# Altium footprint library IC.PcbLib: 220 footprints (part 8 of 14)
Each footprint in its own frame and in the unit in brackets; x right, y up, seen from the top. Pads: shape width x height; smd on the part's side, far side on the other; paste and mask are expansions set on the pad; w line width, h text height; cw(c..) or ccw(c..) is an arc to the next point about the centre after c.
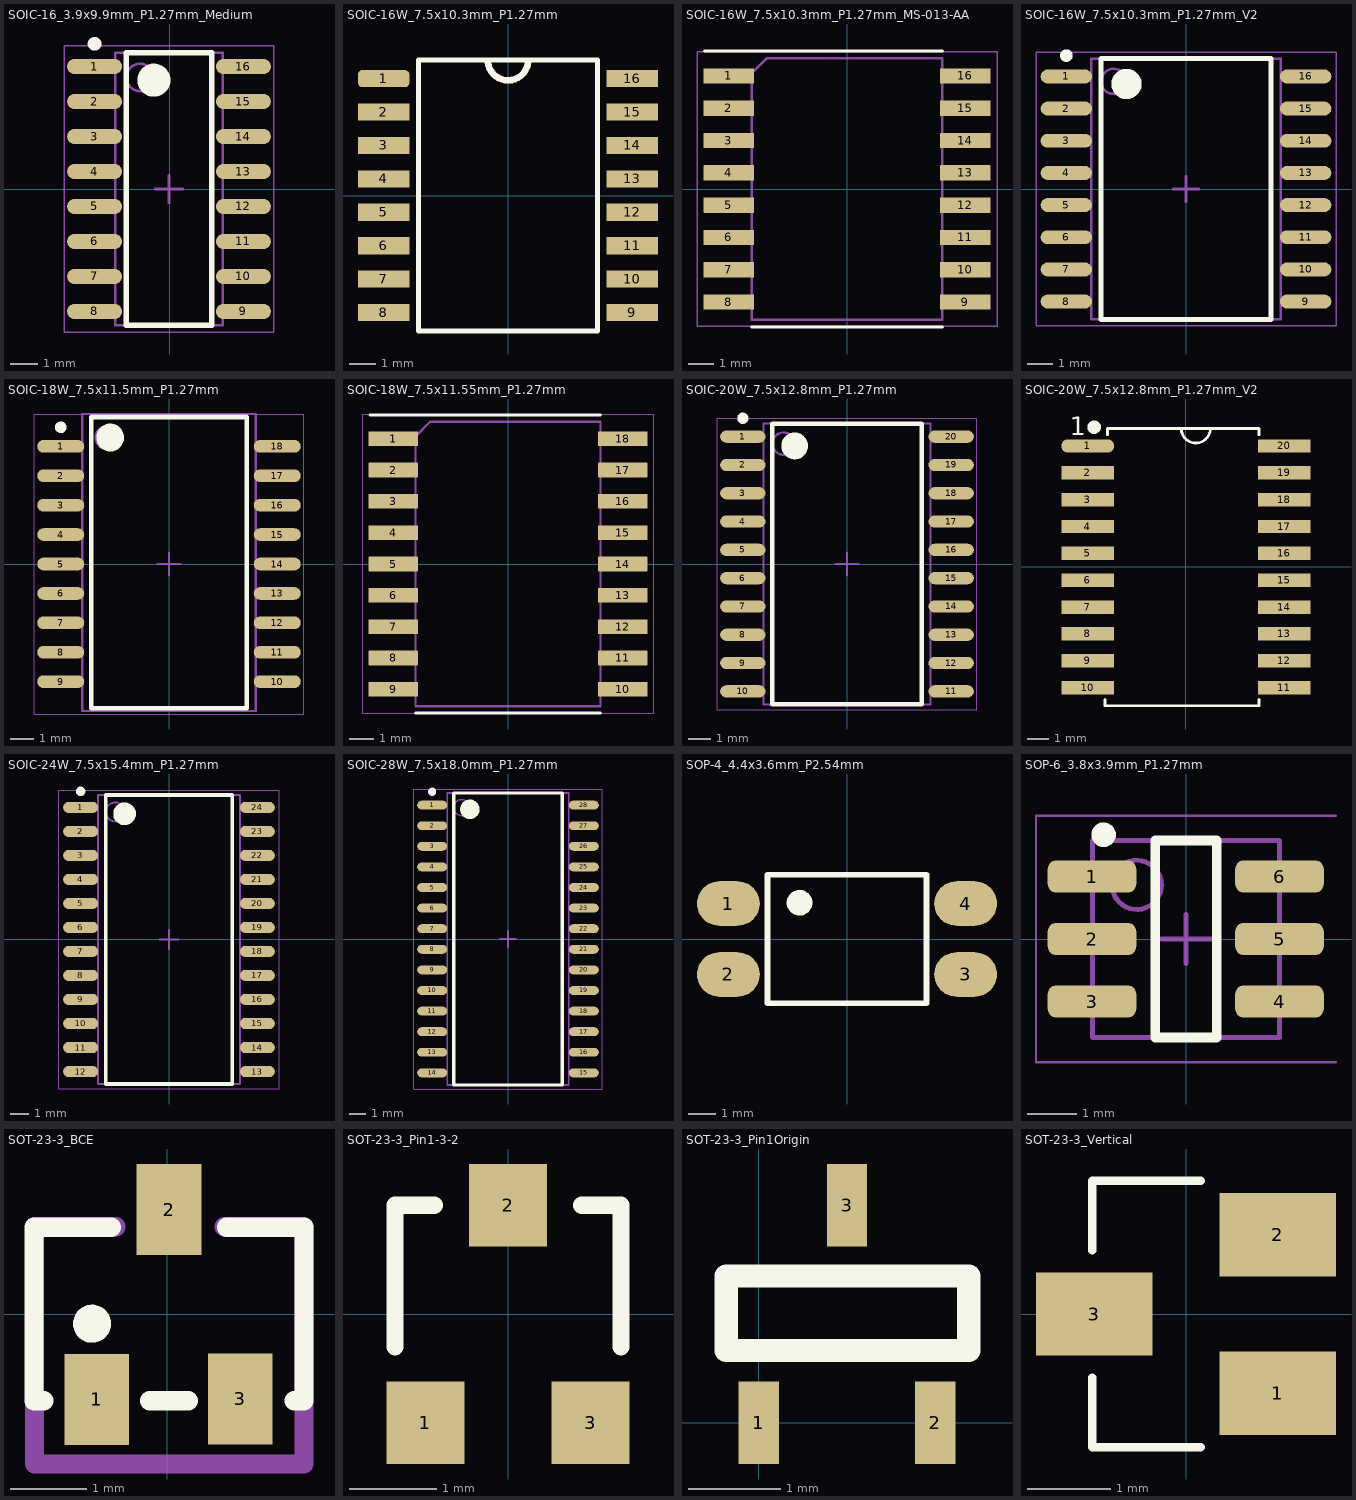
[diagram p7: the footprints below, top view; thin cyan lines are the x and y axes]

## SOIC-16_3.9x9.9mm_P1.27mm_Medium [mm] "SOIC-16 narrow (150mil), body 3.9x9.9mm, pitch 1.27mm, IPC medium"
height 1.75
pads (16):
  oval 2x0.55 smd: 1(-2.727,4.455) 2(-2.727,3.185) 3(-2.727,1.915) 4(-2.727,0.645) 5(-2.727,-0.625) 6(-2.727,-1.895) 7(-2.727,-3.165) 8(-2.727,-4.435) 9(2.673,-4.435) 10(2.673,-3.165) 11(2.673,-1.895) 12(2.673,-0.625) 13(2.673,0.645) 14(2.673,1.915) 15(2.673,3.185) 16(2.673,4.455)
Top Overlay:
  circle w0.6: c-0.577,3.96 r0.3
  circle w0.25: c-2.727,5.28 r0.125
  lines w0.2: -1.577,-4.94 1.523,-4.94 1.523,4.96 -1.577,4.96 -1.577,-4.94
Mechanical 13:
  circle w0.1: c-1.077,4.06 r0.5
  lines w0.1: -1.977,-4.94 1.923,-4.94 1.923,4.96 -1.977,4.96 -1.977,-4.94
Mechanical 15:
  lines w0.05: -3.837,-5.19 3.783,-5.19 3.783,5.21 -3.837,5.21 -3.837,-5.19
  lines w0.1: -0.527,0.01 0.473,0.01 ; -0.027,-0.49 -0.027,0.51
3D body "User Library-SOIC-16-1.step": height 1.4, standoff 0, extent -3.027,-4.94 2.973,4.96

## SOIC-16W_7.5x10.3mm_P1.27mm [mm] "SOIC-16 wide (300mil), body 7.5x10.3mm, pitch 1.27mm"
height 2.6
pads (16):
  rrect50% 1.95x0.65 smd: 1(-4.725,4.445)
  rect 1.95x0.65 smd: 2(-4.725,3.175) 3(-4.725,1.905) 4(-4.725,0.635) 5(-4.725,-0.635) 6(-4.725,-1.905) 7(-4.725,-3.175) 8(-4.725,-4.445) 9(4.725,-4.445) 10(4.725,-3.175) 11(4.725,-1.905) 12(4.725,-0.635) 13(4.725,0.635) 14(4.725,1.905) 15(4.725,3.175) 16(4.725,4.445)
Top Overlay:
  lines w0.2: -3.4,-5.15 3.4,-5.15 3.4,5.15 -3.4,5.15 -3.4,-5.15
  lines w0.254: -0.767,5.077 ccw(c0,5.15) 0.769,5.105
3D body "ACS720KLATR-65AB-T.stp": height 2.65, standoff 0, extent -5.15,-5.15 5.15,5.15

## SOIC-16W_7.5x10.3mm_P1.27mm_MS-013-AA [mm] "16-lead IC package, 7.5 × 10.3 mm, 1.27 mm pitch — Vỏ IC 16 chân, thân 7.5 × 10.3 mm, bước chân 1.27 mm [Vo IC 16 chan, than 7.5 × 10.3 mm, buoc chan 1.27 mm]"
height 2.65
pads (16):
  rrect8% 2x0.6 smd: 1(-4.65,4.445) 2(-4.65,3.175) 3(-4.65,1.905) 4(-4.65,0.635) 5(-4.65,-0.635) 6(-4.65,-1.905) 7(-4.65,-3.175) 8(-4.65,-4.445) 9(4.65,-4.445) 10(4.65,-3.175) 11(4.65,-1.905) 12(4.65,-0.635) 13(4.65,0.635) 14(4.65,1.905) 15(4.65,3.175) 16(4.65,4.445)
Top Overlay:
  lines w0.12: -5.6,5.42 3.75,5.42 ; -3.75,-5.42 3.75,-5.42
  text ".Designator" at -3.75,5.6 h1
Mechanical 2:
  lines w0.1: -3.75,-5.15 3.75,-5.15 3.75,5.15 -3.15,5.15 -3.75,4.55 -3.75,-5.15
Mechanical 4:
  lines w0.05: -5.9,-5.4 5.9,-5.4 5.9,5.4 -5.9,5.4 -5.9,-5.4
3D body "SOIC-16W_7.5x10.3mm_P1.27mm_MS-013-AA.step": height 0, standoff 0, extent -5.65,-4.745 5.65,4.745

## SOIC-16W_7.5x10.3mm_P1.27mm_V2 [mm] "SOIC-16 wide (300mil), body 7.5x10.3mm, pitch 1.27mm, SO-16W 3D"
height 2.4
pads (16):
  oval 2.032x0.55 smd: 1(-4.725,4.445) 2(-4.725,3.175) 3(-4.725,1.905) 4(-4.725,0.635) 5(-4.725,-0.635) 6(-4.725,-1.905) 7(-4.725,-3.175) 8(-4.725,-4.445) 9(4.725,-4.445) 10(4.725,-3.175) 11(4.725,-1.905) 12(4.725,-0.635) 13(4.725,0.635) 14(4.725,1.905) 15(4.725,3.175) 16(4.725,4.445)
Top Overlay:
  circle w0.6: c-2.35,4.15 r0.3
  circle w0.25: c-4.725,5.27 r0.125
  lines w0.2: -3.35,-5.15 3.35,-5.15 3.35,5.15 -3.35,5.15 -3.35,-5.15
Mechanical 13:
  circle w0.1: c-2.85,4.25 r0.5
  lines w0.1: -3.75,-5.15 3.75,-5.15 3.75,5.15 -3.75,5.15 -3.75,-5.15
Mechanical 15:
  lines w0.05: -5.925,-5.4 5.925,-5.4 5.925,5.4 -5.925,5.4 -5.925,-5.4
  lines w0.1: -0.5,0 0.5,0 ; 0,-0.5 0,0.5
3D body "User Library-SO-16W.STEP": height 2.48, standoff 0, extent -5.155,-5.165 5.155,5.165

## SOIC-18W_7.5x11.5mm_P1.27mm [mm] "SOIC-18 wide (300mil), body 7.5x11.5mm, pitch 1.27mm"
height 2.3
pads (18):
  oval 2.032x0.55 smd: 1(-4.675,5.08) 2(-4.675,3.81) 3(-4.675,2.54) 4(-4.675,1.27) 5(-4.675,0) 6(-4.675,-1.27) 7(-4.675,-2.54) 8(-4.675,-3.81) 9(-4.675,-5.08) 10(4.675,-5.08) 11(4.675,-3.81) 12(4.675,-2.54) 13(4.675,-1.27) 14(4.675,0) 15(4.675,1.27) 16(4.675,2.54) 17(4.675,3.81) 18(4.675,5.08)
Top Overlay:
  circle w0.25: c-4.675,5.905 r0.125
  circle w0.6: c-2.54,5.461 r0.3
  lines w0.2: -3.35,-6.223 -3.35,6.35 3.35,6.35 3.35,-6.223 -3.35,-6.223
Mechanical 13:
  circle w0.1: c-2.667,5.461 r0.5
  lines w0.1: -3.75,-6.35 -3.75,6.477 3.75,6.477 3.75,-6.35 -3.75,-6.35
Mechanical 15:
  lines w0.05: -5.825,-6.477 -5.825,6.477 5.825,6.477 5.825,-6.477 -5.825,-6.477
  lines w0.1: -0.5,0 0.5,0 ; 0,-0.5 0,0.5
3D body "User Library-SOIC18-300.step": height 2.7, standoff 0.05, extent -5.15,-5.765 5.15,5.765

## SOIC-18W_7.5x11.55mm_P1.27mm [mm] "ULN2803ADWR, Eight-channel 50 V Darlington sink array, 500 mA per channel max — Mảng đệm Darlington kéo dòng tám kênh, 50 V, tối đa 500 mA mỗi kênh [Mang dem Darlington keo dong tam kenh, 50 V, toi da 500 mA moi kenh]"
height 2.65
pads (18):
  rrect8% 2x0.6 smd: 1(-4.65,5.08) 2(-4.65,3.81) 3(-4.65,2.54) 4(-4.65,1.27) 5(-4.65,0) 6(-4.65,-1.27) 7(-4.65,-2.54) 8(-4.65,-3.81) 9(-4.65,-5.08) 10(4.65,-5.08) 11(4.65,-3.81) 12(4.65,-2.54) 13(4.65,-1.27) 14(4.65,0) 15(4.65,1.27) 16(4.65,2.54) 17(4.65,3.81) 18(4.65,5.08)
Top Overlay:
  lines w0.12: -5.6,6.045 3.75,6.045 ; -3.75,-6.045 3.75,-6.045
  text ".Designator" at -3.75,6.25 h1
Mechanical 2:
  lines w0.1: -3.75,-5.775 3.75,-5.775 3.75,5.775 -3.15,5.775 -3.75,5.175 -3.75,-5.775
Mechanical 4:
  lines w0.05: -5.9,-6.05 5.9,-6.05 5.9,6.05 -5.9,6.05 -5.9,-6.05
3D body "SOIC-18W_7.5x11.55mm_P1.27mm.step": height 0, standoff 0, extent -5.65,-5.38 5.65,5.38

## SOIC-20W_7.5x12.8mm_P1.27mm [mm] "SOIC-20 wide (300mil), body 7.5x12.8mm, pitch 1.27mm"
height 2.65
pads (20):
  oval 2.032x0.55 smd: 1(-4.675,5.715) 2(-4.675,4.445) 3(-4.675,3.175) 4(-4.675,1.905) 5(-4.675,0.635) 6(-4.675,-0.635) 7(-4.675,-1.905) 8(-4.675,-3.175) 9(-4.675,-4.445) 10(-4.675,-5.715) 11(4.675,-5.715) 12(4.675,-4.445) 13(4.675,-3.175) 14(4.675,-1.905) 15(4.675,-0.635) 16(4.675,0.635) 17(4.675,1.905) 18(4.675,3.175) 19(4.675,4.445) 20(4.675,5.715)
Top Overlay:
  circle w0.6: c-2.35,5.3 r0.3
  circle w0.25: c-4.675,6.54 r0.125
  lines w0.2: -3.35,-6.3 3.35,-6.3 3.35,6.3 -3.35,6.3 -3.35,-6.3
Mechanical 13:
  circle w0.1: c-2.85,5.4 r0.5
  lines w0.1: -3.75,-6.3 3.75,-6.3 3.75,6.3 -3.75,6.3 -3.75,-6.3
Mechanical 15:
  lines w0.05: -5.825,-6.55 5.825,-6.55 5.825,6.55 -5.825,6.55 -5.825,-6.55
  lines w0.1: -0.5,0 0.5,0 ; 0,-0.5 0,0.5
3D body "User Library-SOIC20.step": height 2.25, standoff 0.01, extent -5.067,-6.3 5.067,6.3

## SOIC-20W_7.5x12.8mm_P1.27mm_V2 [mm] "SOIC-20 wide (300mil), body 7.5x12.8mm, pitch 1.27mm, span 9.3mm"
pads (20):
  oval 2.5x0.635 smd mask+0.076: 1(-4.65,5.715)
  rect 2.5x0.635 smd mask+0.076: 2(-4.65,4.445) 3(-4.65,3.175) 4(-4.65,1.905) 5(-4.65,0.635) 6(-4.65,-0.635) 7(-4.65,-1.905) 8(-4.65,-3.175) 9(-4.65,-4.445) 10(-4.65,-5.715) 11(4.65,-5.715) 12(4.65,-4.445) 13(4.65,-3.175) 14(4.65,-1.905) 15(4.65,-0.635) 16(4.65,0.635) 17(4.65,1.905) 18(4.65,3.175) 19(4.65,4.445) 20(4.65,5.715)
Top Overlay:
  circle w0.381: c-4.346,6.604 r0.127
  lines w0.127: -3.836,-6.283 -3.836,-6.575 3.45,-6.575 3.45,-6.283 ; -3.711,6.248 -3.711,6.54 3.45,6.54 3.45,6.248 ; -0.224,6.54 ccw(c0.463,6.54) 1.15,6.54
  text "1" at -5.489,6.223 h0.89
3D body "User Library-SOIC20.step": height 2.25, standoff 0.01, extent -5.067,-6.3 5.067,6.3

## SOIC-24W_7.5x15.4mm_P1.27mm [mm] "SOIC-24 wide (300mil), body 7.5x15.4mm, pitch 1.27mm"
height 2.3
pads (24):
  oval 1.85x0.6 smd: 1(-4.675,6.985) 2(-4.675,5.715) 3(-4.675,4.445) 4(-4.675,3.175) 5(-4.675,1.905) 6(-4.675,0.635) 7(-4.675,-0.635) 8(-4.675,-1.905) 9(-4.675,-3.175) 10(-4.675,-4.445) 11(-4.675,-5.715) 12(-4.675,-6.985) 13(4.675,-6.985) 14(4.675,-5.715) 15(4.675,-4.445) 16(4.675,-3.175) 17(4.675,-1.905) 18(4.675,-0.635) 19(4.675,0.635) 20(4.675,1.905) 21(4.675,3.175) 22(4.675,4.445) 23(4.675,5.715) 24(4.675,6.985)
Top Overlay:
  circle w0.25: c-4.675,7.835 r0.125
  circle w0.6: c-2.35,6.65 r0.3
  lines w0.2: -3.35,-7.65 -3.35,7.65 3.35,7.65 3.35,-7.65 -3.35,-7.65
Mechanical 13:
  circle w0.1: c-2.85,6.75 r0.5
  lines w0.1: -3.75,-7.65 -3.75,7.65 3.75,7.65 3.75,-7.65 -3.75,-7.65
Mechanical 15:
  lines w0.05: -5.825,-7.9 -5.825,7.9 5.825,7.9 5.825,-7.9 -5.825,-7.9
  lines w0.1: -0.5,0 0.5,0 ; 0,-0.5 0,0.5
3D body "User Library-SOIC_24.STEP": height 2.6, standoff 0, extent -5.2,-7.835 5.2,7.565

## SOIC-28W_7.5x18.0mm_P1.27mm [mm] "SOIC-28 wide (300mil), body 7.5x18.0mm, pitch 1.27mm"
height 2.3
pads (28):
  oval 1.85x0.55 smd: 1(-4.675,8.255) 2(-4.675,6.985) 3(-4.675,5.715) 4(-4.675,4.445) 5(-4.675,3.175) 6(-4.675,1.905) 7(-4.675,0.635) 8(-4.675,-0.635) 9(-4.675,-1.905) 10(-4.675,-3.175) 11(-4.675,-4.445) 12(-4.675,-5.715) 13(-4.675,-6.985) 14(-4.675,-8.255) 15(4.675,-8.255) 16(4.675,-6.985) 17(4.675,-5.715) 18(4.675,-4.445) 19(4.675,-3.175) 20(4.675,-1.905) 21(4.675,-0.635) 22(4.675,0.635) 23(4.675,1.905) 24(4.675,3.175) 25(4.675,4.445) 26(4.675,5.715) 27(4.675,6.985) 28(4.675,8.255)
Top Overlay:
  circle w0.6: c-2.35,8 r0.3
  circle w0.25: c-4.675,9.08 r0.125
  lines w0.2: -3.35,-9 3.35,-9 3.35,9 -3.35,9 -3.35,-9
Mechanical 13:
  circle w0.1: c-2.85,8.1 r0.5
  lines w0.1: -3.75,-9 3.75,-9 3.75,9 -3.75,9 -3.75,-9
Mechanical 15:
  lines w0.05: -5.825,-9.25 5.825,-9.25 5.825,9.25 -5.825,9.25 -5.825,-9.25
  lines w0.1: -0.5,0 0.5,0 ; 0,-0.5 0,0.5
3D body "User Library-28-SOIC.step": height 2.73, standoff -0.03, extent -5.023,-9.01 5.277,8.89

## SOP-4_4.4x3.6mm_P2.54mm [mm] "SOP-4 optocoupler/SMD package, pitch 2.54mm, span 8.5mm"
pads (4):
  oval 2.25x1.6 smd: 1(-4.25,1.27) 2(-4.25,-1.27) 3(4.25,-1.27) 4(4.25,1.27)
Top Overlay:
  circle w0.2: c-1.7,1.3 r0.361
  region: -1.4,1.003 -2.006,1.003 -2.006,1.6 -1.4,1.6
  lines w0.2: -2.85,-2.3 2.85,-2.3 2.85,2.3 -2.85,2.3 -2.85,-2.3
3D body "pc817x1nip1b.stp": height 3.6, standoff 0, extent -4.673,-2.286 4.927,2.314

## SOP-6_3.8x3.9mm_P1.27mm [mm] "SOP-6, pitch 1.27mm, span 3.81mm"
height 1.1
pads (6):
  rrect50% 1.8x0.65 smd: 1(-1.91,1.27) 2(-1.91,0) 3(-1.91,-1.27) 4(1.9,-1.27) 5(1.9,0) 6(1.9,1.27)
Top Overlay:
  circle w0.25: c-1.675,2.12 r0.125
  lines w0.2: -0.625,-2 0.625,-2 0.625,2 -0.625,2 -0.625,-2
Mechanical 13:
  circle w0.1: c-1,1.1 r0.5
  lines w0.1: -1.9,-2 1.9,-2 1.9,2 -1.9,2 -1.9,-2
Mechanical 15:
  lines w0.05: 3.048,-2.5 -3.048,-2.5 -3.048,2.5 3.048,2.5
  lines w0.1: -0.5,0 0.5,0 ; 0,-0.5 0,0.5
3D body "SOIC127P490X150-6N.step": height 1.5, standoff 0, extent -2.45,-2 2.45,2

## SOT-23-3_BCE [mm] "SOT-23-3 transistor/supervisor footprint (1-3 bottom, 2 top)"
pads (3):
  rect 0.85x1.2 smd: 1(-0.927,-1.123) 2(0.023,1.377) 3(0.963,-1.118)
Top Overlay:
  circle w0.25: c-0.991,-0.127 r0.125
  lines w0.254: -1.628,-1.143 -1.755,-1.143 -1.755,1.143 -0.739,1.143 ; -0.231,-1.143 0.277,-1.143 ; 0.785,1.143 1.801,1.143 1.801,-1.143 1.674,-1.143
Mechanical 13:
  lines w0.254: -0.675,1.15 -1.75,1.15 -1.75,-1.975 1.8,-1.975 1.8,1.15 0.75,1.15
  text "E" at 0.9,-0.25 h0.64
  text "C" at -0.1,0 h0.64
3D body "SW3DPS-SOT-23-DEFAULT.STEP": height 1.06, standoff -0.04, extent -1.477,-1.174 1.523,1.326

## SOT-23-3_Pin1-3-2 [mm] "SOT-23-3 with pin 2 on single-pad side (1-3 bottom, 2 top)"
height 1.1
pads (3):
  rect 0.9x0.95 smd: 1(-0.95,-1.25) 2(0,1.25)
  rect 0.9x0.95 smd mask+0: 3(0.95,-1.25)
Top Overlay:
  lines w0.2: -1.3,-0.375 -1.3,1.25 -0.85,1.25 ; 0.85,1.25 1.3,1.25 1.3,-0.375
3D body "SW3DPS-SOT-23-DEFAULT.STEP": height 1.06, standoff -0.04, extent -1.524,-1.23 1.476,1.27

## SOT-23-3_Pin1Origin [mm] "SOT-23-3 standard pinout (1-2 bottom, 3 top), pin-1 origin"
pads (3):
  rect 0.44x0.9 smd: 1(0,0) 2(1.92,0) 3(0.96,2.37)
Top Overlay:
  lines w0.254: -0.356,0.787 2.286,0.787 2.286,1.6 -0.356,1.6 -0.356,0.787
3D body "User Library-SOT23-3.step": height 1.3, standoff 0, extent -0.434,-0.13 2.466,2.67

## SOT-23-3_Vertical [mm] "SOT-23-3 (TO-236AA), pins 1-2 right, pin 3 left"
height 1.1
pads (3):
  rect 1.4x1 smd paste+0 mask+0.076: 1(1.1,-0.95) 2(1.1,0.95) 3(-1.1,0)
Top Overlay:
  lines w0.1: -1.125,-0.762 -1.125,-1.6 0.175,-1.6 ; -1.125,0.763 -1.125,1.6 0.175,1.6
3D body "SOT23_TO-236AA.STEP": height 1.3, standoff 0, extent -1.5,-1.5 1.5,1.5